# Altium footprint library hphonglib.PcbLib: 703 footprints (part 8 of 44)
Each footprint in its own frame and in the unit in brackets; x right, y up, seen from the top. Pads: shape width x height; smd on the part's side, far side on the other; paste and mask are expansions set on the pad; w line width, h text height; cw(c..) or ccw(c..) is an arc to the next point about the centre after c.
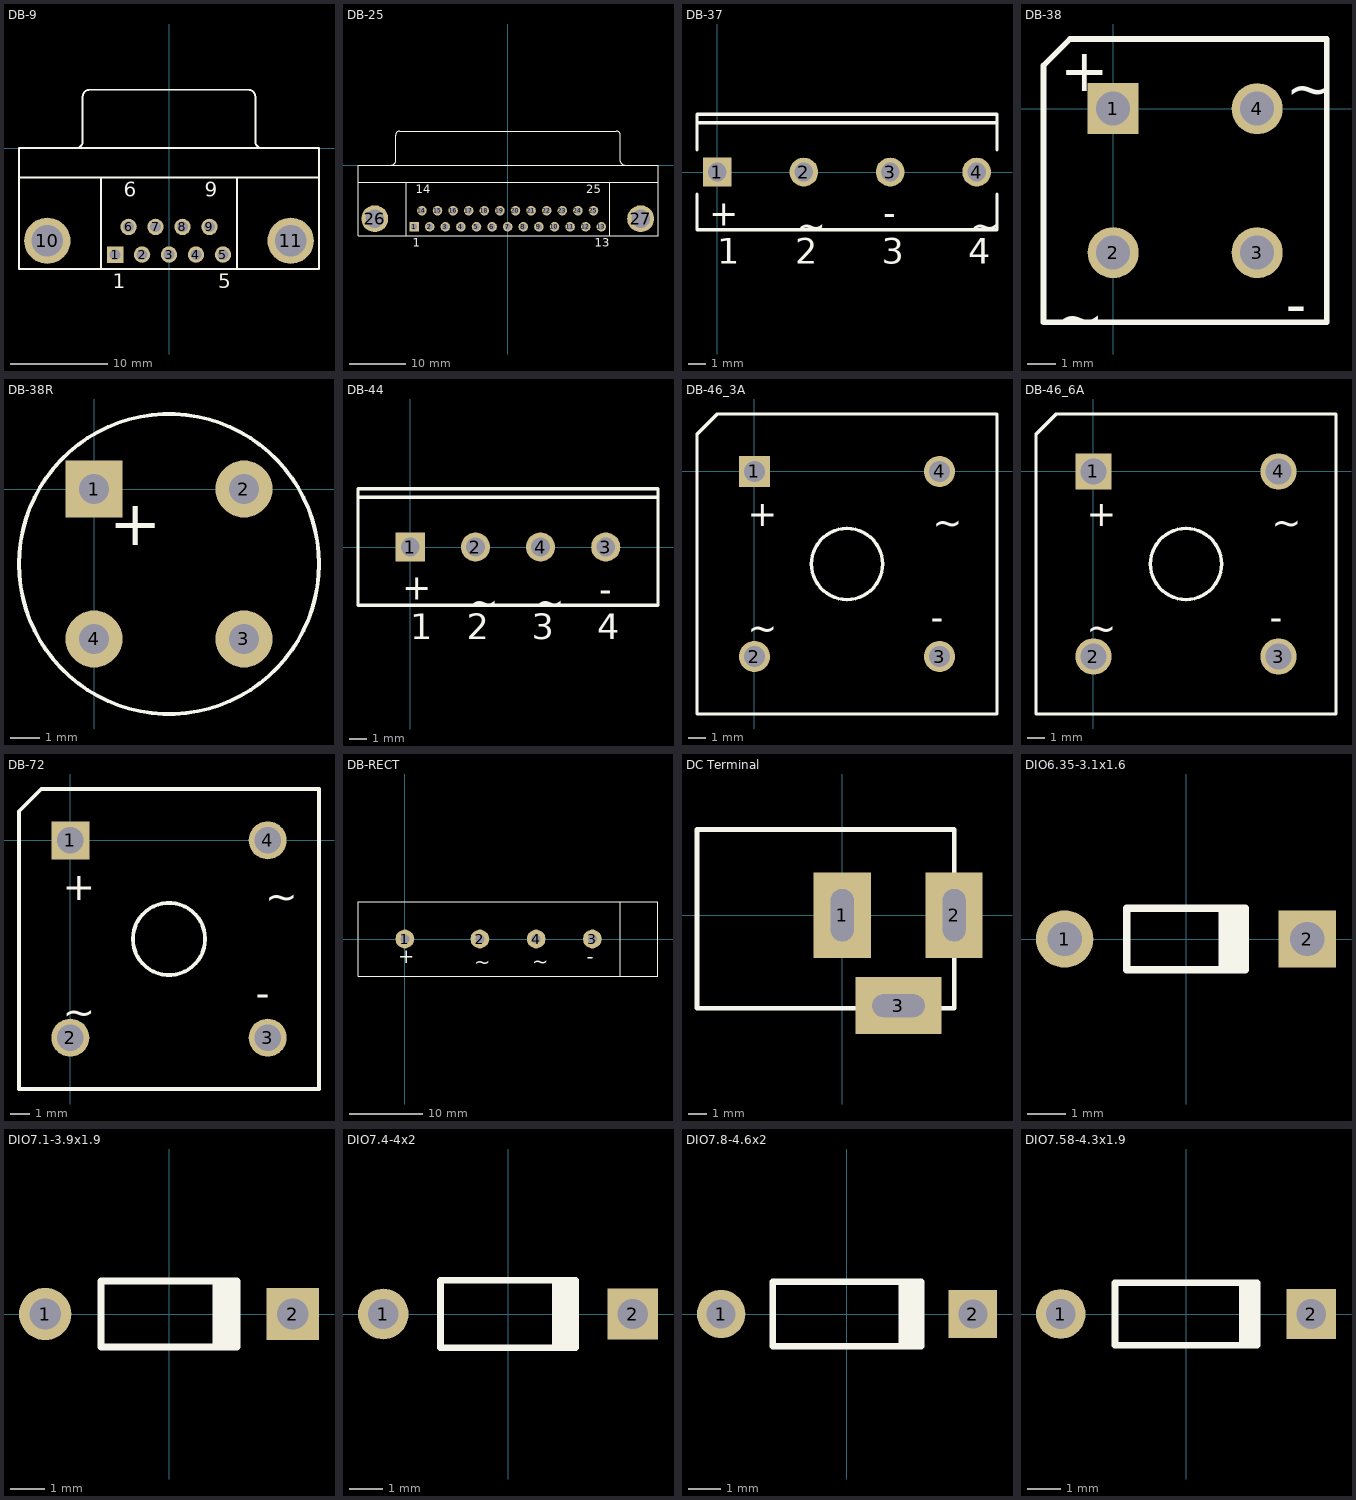
[diagram p7: the footprints below, top view; thin cyan lines are the x and y axes]

## DB-9 [mm] "Connector; D Subminiature; 9 Position; Right Angle; Pitch 1.385 mm"
height 12.75
pads (11):
  rect 1.69x1.69 hole 1.09: 1(-5.54,-10.92)
  round 1.69 hole 1.09: 2(-2.77,-10.92) 3(0,-10.92) 4(2.77,-10.92) 5(5.54,-10.92) 6(-4.155,-8.08) 7(-1.385,-8.08) 8(1.385,-8.08) 9(4.155,-8.08)
  round 4.76 hole 3.26: 10(-12.495,-9.5) 11(12.495,-9.5)
Top Overlay:
  lines w0.2: -15.4,-3 15.4,-3 ; -9.56,0.005 ccw(c-9.56,0.7) -8.865,0.7 -8.865,5.3 ; -8.86,5.305 cw(c-8.165,5.305) -8.165,6 8.165,6 cw(c8.165,5.305) 8.86,5.305 ; -7,-12.4 -7,-3 ; 7,-12.4 7,-3 ; 8.865,5.3 8.865,0.7 ccw(c9.56,0.7) 9.56,0.005 ; -15.4,-12.4 15.4,-12.4 15.4,0 -15.4,0 -15.4,-12.4
  text "6" at -4.655,-4.975 h1.5
  text "9" at 3.655,-4.975 h1.5
  text "5" at 5.04,-14.375 h1.5
  text "1" at -5.79,-14.375 h1.5
3D body: height 3.34, standoff -12.96, extent -15.405,-12.473 15.405,8.227

## DB-25 [mm] "Connector; D Subminiature; 25 Position; Right Angle; Pitch 1.385 mm"
height 12.93
pads (27):
  rect 1.69x1.69 hole 1.09: 1(-16.566,-10.92)
  round 1.69 hole 1.09: 2(-13.805,-10.92) 3(-11.044,-10.92) 4(-8.283,-10.92) 5(-5.522,-10.92) 6(-2.761,-10.92) 7(0,-10.92) 8(2.761,-10.92) 9(5.522,-10.92) 10(8.283,-10.92) 11(11.044,-10.92) 12(13.805,-10.92) 13(16.566,-10.92) 14(-15.185,-8.08) 15(-12.424,-8.08) 16(-9.663,-8.08) 17(-6.902,-8.08) 18(-4.141,-8.08) 19(-1.38,-8.08) 20(1.381,-8.08) 21(4.142,-8.08) 22(6.903,-8.08) 23(9.664,-8.08) 24(12.425,-8.08) 25(15.186,-8.08)
  round 4.76 hole 3.26: 26(-23.526,-9.5) 27(23.526,-9.5)
Top Overlay:
  lines w0.2: -26.496,-3 26.604,-3 ; -20.541,0.005 ccw(c-20.541,0.7) -19.846,0.7 -19.846,5.3 ; -19.841,5.305 cw(c-19.146,5.305) -19.146,6 19.254,6 cw(c19.254,5.305) 19.949,5.305 ; -17.946,-12.5 -17.946,-3 ; 18.054,-12.5 18.054,-3 ; 19.954,5.3 19.954,0.7 ccw(c20.649,0.7) 20.649,0.005 ; -26.496,-12.5 -26.496,0 26.604,0 26.604,-12.5 -26.496,-12.5
  text "25" at 13.936,-4.975 h1.5
  text "14" at -16.31,-4.975 h1.5
  text "13" at 15.441,-14.475 h1.5
  text "1" at -16.816,-14.475 h1.5
3D body: height 3.37, standoff -12.93, extent -26.55,-12.473 26.55,8.227

## DB-37 [mm] "SIP; 4 Leads; Body 15 x 17.5 x 6.8 mm (typ); Pitch 5.1 mm"
height 15
pads (4):
  rect 1.7x1.7 hole 1.1: 1(0,0)
  round 1.7 hole 1.1: 2(5.1,0) 3(10.2,0) 4(15.3,0)
Top Overlay:
  lines w0.2: -1.2,-1.3 -1.2,-3.4 16.5,-3.4 16.5,-1.3 ; -1.2,1.3 -1.2,3.4 16.5,3.4 16.5,1.3 ; -1.2,2.9 16.5,2.9
  text "~" at 14.92,-3.9 h1.5
  text "~" at 4.68,-3.9 h1.5
  text "+" at -0.49,-3.16 h1.5
  text "-" at 9.78,-3.15 h1.5
  text "4" at 14.792,-5.4 h1.5
  text "3" at 9.692,-5.4 h1.5
  text "2" at 4.592,-5.4 h1.5
  text "1" at 0,-5.4 h1.5

## DB-38 [mm] "Bridge Rectifier; 4 Terminals; Body 9.4 x 9.4 mm (typ); Pitch 5.08 mm"
height 9.91
pads (4):
  rect 1.8x1.8 hole 1.2: 1(0,0)
  round 1.8 hole 1.2: 2(0,-5.08) 3(5.08,-5.08) 4(5.08,0)
Top Overlay:
  lines w0.2: -2.46,-7.54 7.54,-7.54 7.54,2.46 -1.524,2.46 -2.46,1.524 -2.46,-7.54
  text "~" at 6.096,0 h1.5
  text "~" at -2.032,-8.128 h1.5
  text "-" at 6.096,-7.62 h1.5
  text "+" at -1.87,0.624 h1.5

## DB-38R [mil] "Body round diam. 9mm"
pads (4):
  rect 76x76 hole 39.37 unplated: 1(0,0)
  round 76 hole 39.37 unplated: 2(200,0) 3(200,-200) 4(0,-200)
Top Overlay:
  circle w5: c100,-100 r200
  text "+" at 20,-75 h60.8
3D body: height 196.85, standoff 3.94, extent -100.82,-300.63 300.63,99.84
3D body: height 197.64, standoff 196.85, extent -30.84,-28.87 29.85,31.82
3D body: height 197.64, standoff 196.85, extent -20.01,-209.97 25.91,-193.9
3D body: height 197.64, standoff 196.85, extent 176.84,-9.18 222.77,6.89
3D body: height 197.64, standoff 196.85, extent 166.59,-199.92 224,-191.65

## DB-44 [mm] "SIP; 4 Leads; Body 15 x 17.5 x 6.8 mm (typ); Pitch 3.8 mm"
height 15
pads (4):
  rect 1.7x1.7 hole 1.1: 1(0,0)
  round 1.7 hole 1.1: 2(3.8,0) 3(11.4,0) 4(7.6,0)
Top Overlay:
  lines w0.2: -3.05,2.9 14.45,2.9 ; -3.05,-3.4 14.45,-3.4 14.45,3.4 -3.05,3.4 -3.05,-3.4
  text "-" at 11.02,-3.19 h1.5
  text "+" at -0.48,-3.08 h1.5
  text "~" at 7.3,-3.94 h1.5
  text "~" at 3.43,-3.94 h1.5
  text "1" at 0,-5.38 h1.5
  text "2" at 3.292,-5.38 h1.5
  text "3" at 7.092,-5.38 h1.5
  text "4" at 10.892,-5.38 h1.5

## DB-46_3A [mm] "Bridge Rectifier; 4 Terminals; Body 16.8 x 16.8 mm (typ); Pitch 10.67 mm"
height 6.35
pads (4):
  rect 1.8x1.8 hole 1.2: 1(0,0)
  round 1.8 hole 1.2: 2(0,-10.67) 3(10.67,-10.67) 4(10.67,0)
Top Overlay:
  circle w0.2: c5.335,-5.335 r2.05
  lines w0.2: -3.315,-13.985 -3.315,2.139 -2.139,3.315 13.985,3.315 13.985,-13.985 -3.315,-13.985
  text "+" at -0.388,-3.168 h1.5
  text "-" at 10.16,-9.144 h1.5
  text "~" at 10.28,-3.676 h1.5
  text "~" at -0.388,-9.772 h1.5

## DB-46_6A [mm] "Bridge Rectifier; 4 Terminals; Body 16.8 x 16.8 mm (typ); Pitch 10.67 mm"
height 6.35
pads (4):
  rect 2.1x2.1 hole 1.5: 1(0,0)
  round 2.1 hole 1.5: 2(0,-10.67) 3(10.67,-10.67) 4(10.67,0)
Top Overlay:
  circle w0.2: c5.335,-5.335 r2.05
  lines w0.2: -3.315,-13.985 13.985,-13.985 13.985,3.315 -2.139,3.315 -3.315,2.139 -3.315,-13.985
  text "~" at -0.388,-9.772 h1.5
  text "~" at 10.28,-3.676 h1.5
  text "-" at 10.16,-9.144 h1.5
  text "+" at -0.388,-3.168 h1.5

## DB-72 [mm] "Bridge Rectifier; 4 Terminals; Body 15.2 x 15.2 mm (typ); Pitch 10.4 mm"
height 5.34
pads (4):
  rect 2x2 hole 1.4: 1(0,0)
  round 2 hole 1.4: 2(0,-10.4) 3(10.4,-10.4) 4(10.4,0)
Top Overlay:
  circle w0.2: c5.2,-5.2 r1.9
  lines w0.2: -2.7,-13.1 -2.7,1.524 -1.524,2.7 13.1,2.7 13.1,-13.1 -2.7,-13.1
  text "+" at -0.388,-3.168 h1.5
  text "-" at 9.772,-8.756 h1.5
  text "~" at 10.28,-3.676 h1.5
  text "~" at -0.388,-9.772 h1.5

## DB-RECT [mm] "SIP Bridge rectifier - body 40x10 mm"
pads (4):
  round 2.54 hole 1.2: 1(0,0) 2(10.16,0) 3(25.4,0) 4(17.78,0)
Top Overlay:
  lines w0.127: 29.21,-5.08 29.21,5.08 ; -6.35,-5.08 34.29,-5.08 34.29,5.08 -6.35,5.08 -6.35,-5.08
  text "~" at 17.272,-3.937 h1.93
  text "~" at 9.398,-4.064 h1.93
  text "-" at 24.638,-3.302 h1.93
  text "+" at -0.889,-3.302 h1.93

## DC Terminal [mil] "DC Terminal; Solder Pad 30mil"
pads (3):
  rect 120x180 hole 48 slot 110 at 90 deg: 1(0,0) 2(235,0)
  rect 180x120 hole 48 slot 110 at 0 deg: 3(118,-190)
Top Overlay:
  lines w10: -305,-195.2 235,-195.2 235,180 -305,180 -305,-195.2
3D body: height 433.07, standoff -157.48, extent -305.43,-208.66 265.43,177.16

## DIO6.35-3.1x1.6 [mm] "Diode, Axial; Body 3 x 1.6 mm (LxDia. max), Lead Dia. 0.55 mm (max)"
height 1.6
pads (2):
  round 1.5 hole 0.9: 1(-3.175,0)
  rect 1.5x1.5 hole 0.9: 2(3.175,0)
Top Overlay:
  rectangle: 0.85,-0.8 1.65,0.8
  lines w0.2: 1.55,-0.8 -1.55,-0.8 -1.55,0.8 1.55,0.8

## DIO7.1-3.9x1.9 [mm] "Diode, Axial; Body 3.8 x 1.9 mm (LxDia. max), Lead Dia. 0.53 mm (max)"
height 1.9
pads (2):
  round 1.5 hole 0.9: 1(-3.55,0)
  rect 1.5x1.5 hole 0.9: 2(3.55,0)
Top Overlay:
  rectangle: 1.25,-0.95 2.05,0.95
  lines w0.2: 1.95,-0.95 -1.95,-0.95 -1.95,0.95 1.95,0.95

## DIO7.4-4x2 [mm] "Diode, Axial; Body 4 x 2 mm (LxDia. max), Lead Dia. 0.6 mm (max)"
height 2
pads (2):
  round 1.5 hole 0.9: 1(-3.7,0)
  rect 1.5x1.5 hole 0.9: 2(3.7,0)
Top Overlay:
  rectangle: 1.3,-1 2.1,1
  lines w0.2: 2,-1 -2,-1 -2,1 2,1

## DIO7.8-4.6x2 [mm] "Diode, Axial; Body 4.6 x 1.9 mm (LxDia. max), Lead Dia. 0.53 mm (max)"
height 2
pads (2):
  round 1.5 hole 0.9: 1(-3.9,0)
  rect 1.5x1.5 hole 0.9: 2(3.9,0)
Top Overlay:
  rectangle: 1.6,-1 2.4,1
  lines w0.2: 2.3,-1 -2.3,-1 -2.3,1 2.3,1

## DIO7.58-4.3x1.9 [mm] "Diode, Axial; Body 4.3 x 1.9 mm (LxDia. max), Lead Dia. 0.56 mm (max)"
height 1.9
pads (2):
  round 1.5 hole 0.9: 1(-3.79,0)
  rect 1.5x1.5 hole 0.9: 2(3.79,0)
Top Overlay:
  rectangle: 1.6,-0.95 2.25,0.95
  lines w0.2: 2.15,-0.95 -2.15,-0.95 -2.15,0.95 2.15,0.95